# Altium footprint library AMA4B_adapter_board.PcbLib: 73 footprints (part 4 of 5)
Each footprint in its own frame and in the unit in brackets; x right, y up, seen from the top. Pads: shape width x height; smd on the part's side, far side on the other; paste and mask are expansions set on the pad; w line width, h text height; cw(c..) or ccw(c..) is an arc to the next point about the centre after c.
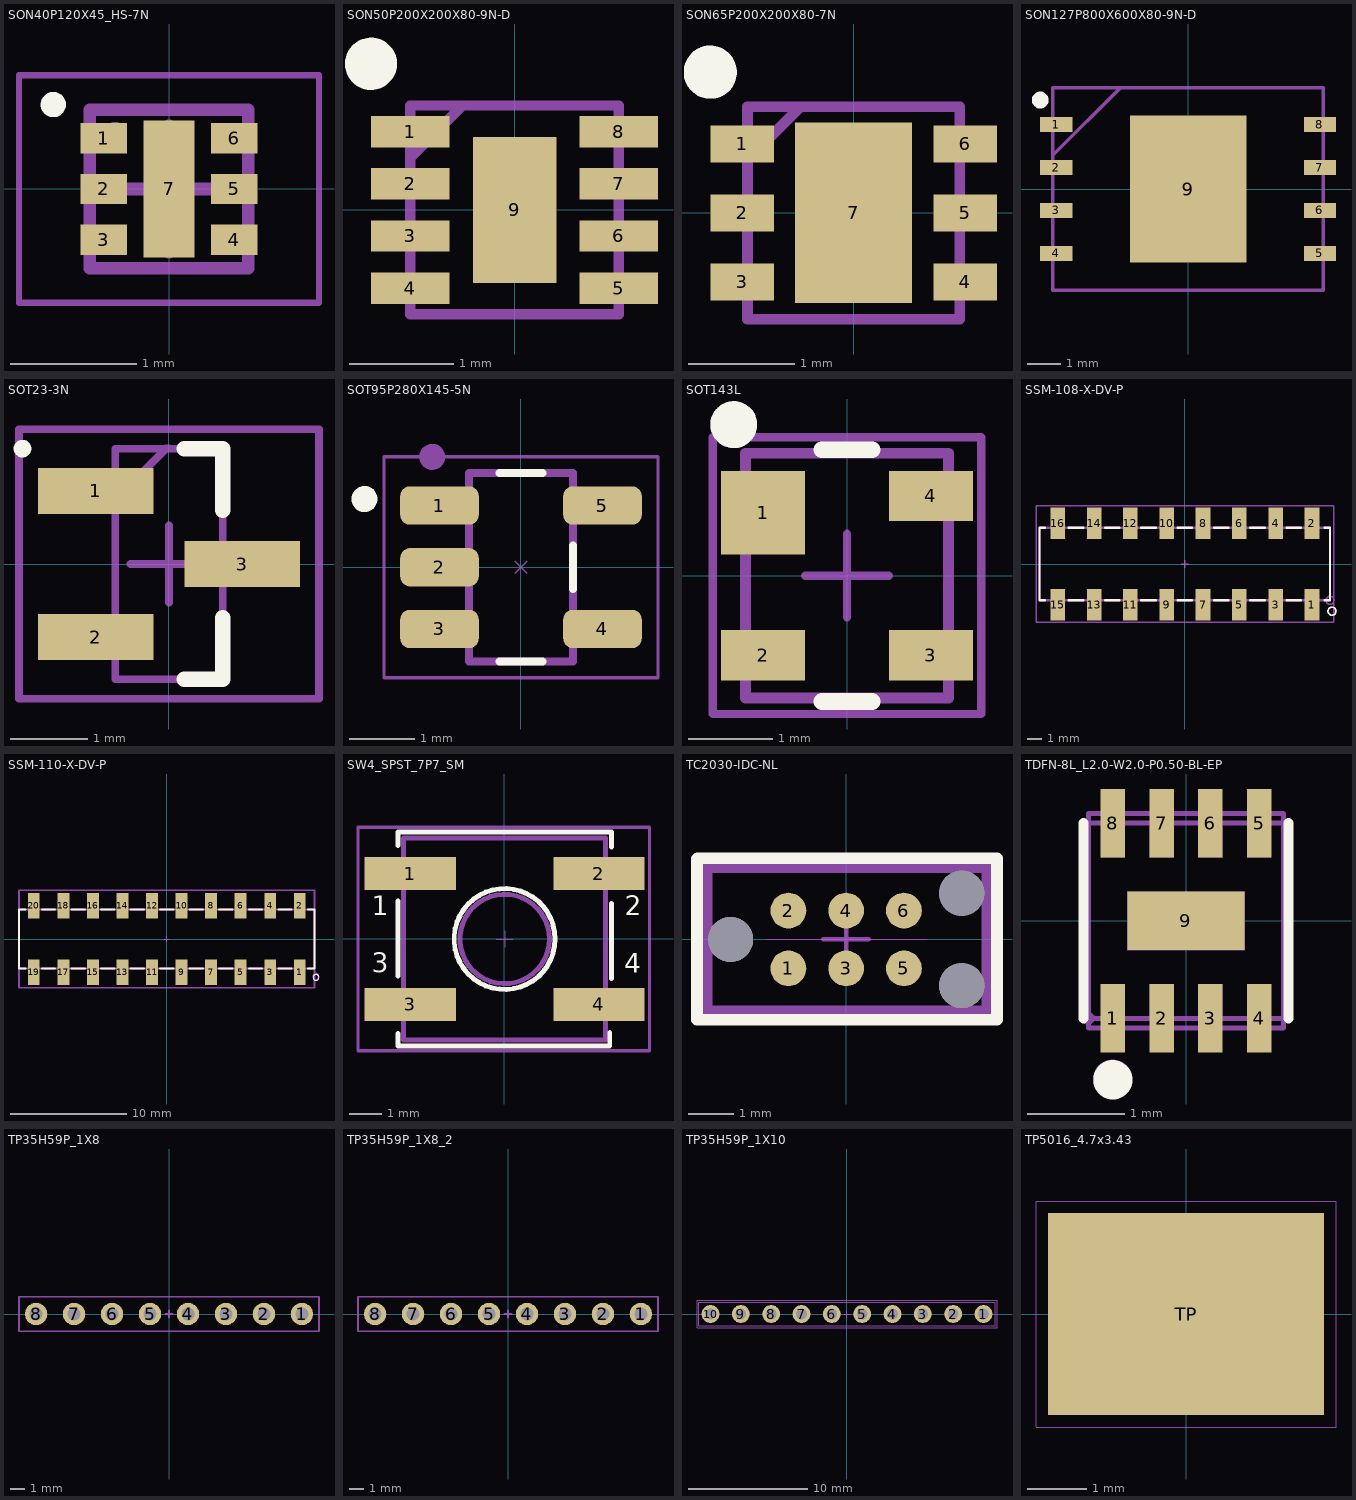
[diagram p3: the footprints below, top view; thin cyan lines are the x and y axes]

## SON40P120X45_HS-7N [mm] "SON, 6-Leads, Body 1.20x1.20mm, Pitch 0.40mm, Thermal Pad 2.40x0.79mm, IPC Medium Density"
height 0.45
pads (7):
  rect 0.37x0.24 smd paste+0 mask+0.03: 1(-0.515,0.4) 2(-0.515,0) 3(-0.515,-0.4) 4(0.515,-0.4) 5(0.515,0) 6(0.515,0.4)
  rect 0.4x1.08 smd paste+0 mask+0.03: 7(0,0)
Top Overlay:
  circle w0.1: c-0.914,0.667 r0.05
Board Shape:
  circle w0.152: c-0.426,0.444 r0.009
  lines w0.1: -0.625,-0.625 -0.625,0.625 0.625,0.625 0.625,-0.625 -0.625,-0.625
  text ".Designator" at -2.261,-0.275 h1
Top Courtyard:
  lines w0.05: -1.185,-0.9 1.185,-0.9 1.185,0.9 -1.185,0.9 -1.185,-0.9
  lines w0.051: -1.185,-0.9 1.185,-0.9 1.185,0.9 -1.185,0.9 -1.185,-0.9
Top Component Center:
  lines w0.1: -0.5,0 0.5,0 ; 0,-0.5 0,0.5
3D body "SON40P120X45_HS-7N.step": height 0.45, standoff 0, extent -0.626,-0.625 0.626,0.625

## SON50P200X200X80-9N-D [mm]
pads (9):
  rect 0.75x0.3 smd: 1(-1,0.75) 2(-1,0.25) 3(-1,-0.25) 4(-1,-0.75) 5(1,-0.75) 6(1,-0.25) 7(1,0.25) 8(1,0.75)
  rect 0.8x1.4 smd: 9(0,0)
Top Overlay:
  circle w0.25: c-1.375,1.4 r0.125
Top 3D Body:
  lines w0.1: -1,0.5 -0.5,1 ; -1,-1 1,-1 1,1 -1,1 -1,-1
3D body "MAX8902BATA+.stp": height 0.8, standoff 0, extent -1.05,-1 1.05,1

## SON65P200X200X80-7N [mm]
pads (7):
  rect 0.6x0.35 smd: 1(-1.05,0.65) 2(-1.05,0) 3(-1.05,-0.65) 4(1.05,-0.65) 5(1.05,0) 6(1.05,0.65)
  rect 1.1x1.7 smd: 7(0,0)
Top Overlay:
  circle w0.25: c-1.35,1.325 r0.125
Top Assembly:
  lines w0.1: -1,0.5 -0.5,1 ; -1,-1 1,-1 1,1 -1,1 -1,-1
  text ".Designator" at -1.126,-0.113 h0.5
3D body "TLV75801PDRVR.stp": height 0.8, standoff 0, extent -1.05,-1 1.05,1

## SON127P800X600X80-9N-D [mm]
pads (9):
  rect 0.95x0.45 smd: 1(-3.9,1.905) 2(-3.9,0.635) 3(-3.9,-0.635) 4(-3.9,-1.905) 5(3.9,-1.905) 6(3.9,-0.635) 7(3.9,0.635) 8(3.9,1.905)
  rect 3.45x4.35 smd: 9(0,0)
Top Overlay:
  circle w0.25: c-4.375,2.63 r0.125
Top Assembly:
  lines w0.1: -4,1 -2,3 ; -4,-3 -4,3 4,3 4,-3 -4,-3
  text ".Designator" at -2.252,-0.226 h1
3D body "W25N01GVZEIG_TR.stp": height 0.8, standoff 0, extent -4.05,-3 4.05,3

## SOT23-3N [mm] "SOT23, 3-Leads, Body 2.9x1.3mm, Pitch 0.95mm, Lead Span 2.5mm, IPC Medium Density"
height 1.1
pads (3):
  rect 1.5x0.6 smd: 1(-0.95,0.95) 2(-0.95,-0.95) 3(0.95,0)
Top Overlay:
  circle w0.152: c-1.905,1.5 r0.038
  lines w0.2: 0.2,-1.5 0.7,-1.5 0.7,-0.7 ; 0.2,1.5 0.7,1.5 0.7,0.7
Board Shape:
  lines w0.1: -0.7,-1.5 -0.7,1.5 0.7,1.5 0.7,-1.5 -0.7,-1.5
  lines w0.102: -0.692,0.847 -0.039,1.5 0,1.5
  text ".Designator" at -2.289,-0.23 h1.02
Top Courtyard:
  lines w0.1: -1.95,-1.75 1.95,-1.75 1.95,1.75 -1.95,1.75 -1.95,-1.75
Top Component Center:
  lines w0.1: -0.5,0 0.5,0 ; 0,-0.5 0,0.5
3D body "SOT23.STEP": height 1.08, standoff 0, extent -1.345,-1.5 1.295,1.5

## SOT95P280X145-5N [mm]
pads (5):
  rrect50% 1.21x0.59 smd: 1(-1.255,0.95) 2(-1.255,0) 3(-1.255,-0.95) 4(1.255,-0.95) 5(1.255,0.95)
Top Overlay:
  circle w0.2: c-2.41,1.05 r0.1
  lines w0.127: -0.33,-1.45 0.33,-1.45 ; -0.33,1.45 0.33,1.45 ; 0.8,-0.335 0.8,0.335
Board Shape:
  lines w0.127: -0.8,-1.45 0.8,-1.45 0.8,1.45 -0.8,1.45 -0.8,-1.45
  lines w0.2: -1.267,1.7 cw(c-1.367,1.7) -1.267,1.703
  text "'.Designator'" at 0.156,-0.6 h1
Top Courtyard:
  lines w0.05: -2.11,-1.7 -2.11,1.7 2.11,1.7 2.11,-1.7 -2.11,-1.7
Top Component Center:
  lines w0.025: -0.09,-0.09 0,0 ; -0.09,0.09 0,0 ; 0.09,-0.09 0,0 ; 0.09,0.09 0,0

## SOT143L [mm]
pads (4):
  rect 1x1 smd: 1(-1,0.75)
  rect 1x0.6 smd: 2(-1,-0.95) 3(1,-0.95) 4(1,0.95)
Top Overlay:
  circle w0.305: c-1.35,1.8 r0.127
  lines w0.2: -0.3,-1.5 0.3,-1.5 ; -0.3,1.5 0.3,1.5
Board Shape:
  circle w0.305: c-1.35,1.8 r0.127
  lines w0.127: -1.21,-1.46 -1.21,1.46 1.21,1.46 1.21,-1.46 -1.21,-1.46
  lines w0.2: -0.3,-1.5 0.3,-1.5 ; -0.3,1.5 0.3,1.5
  text ".Designator" at -0.319,3.459 h1.52
Top 3D Body:
  lines w0.127: -1.21,-1.46 -1.21,1.46 1.21,1.46 1.21,-1.46 -1.21,-1.46
Top Courtyard:
  lines w0.1: -1.6,-1.65 -1.6,1.65 1.6,1.65 1.6,-1.65 -1.6,-1.65
Top Component Center:
  lines w0.1: -0.5,0 0.5,0 ; 0,-0.5 0,0.5
3D body "User Library-sot143.STEP": height 1, standoff 0, extent -1.21,-1.46 1.21,1.46

## SSM-108-X-DV-P [mil] "SSM-108-X-DV-P"
pads (16):
  rect 40.2x87.4 smd: 1(350,-112.5) 2(350,112.5) 3(250,-112.5) 4(250,112.5) 5(150,-112.5) 6(150,112.5) 7(50,-112.5) 8(50,112.5) 9(-50,-112.5) 10(-50,112.5) 11(-150,-112.5) 12(-150,112.5) 13(-250,-112.5) 14(-250,112.5) 15(-350,-112.5) 16(-350,112.5)
Top Overlay:
  circle w4: c405,-130 r11.18
  lines w6: -385,-100 -400,-100 -400,100 -385,100 ; -320,-100 -280,-100 ; -320,100 -280,100 ; -220,-100 -180,-100 ; -220,100 -180,100 ; -120,-100 -80,-100 ; -120,100 -80,100 ; -20,-100 20,-100 ; -20,100 20,100 ; 80,-100 120,-100 ; 80,100 120,100 ; 180,-100 220,-100 ; 180,100 220,100 ; 280,-100 320,-100 ; 280,100 320,100 ; 385,-100 400,-100 400,100 385,100
Board Shape:
  circle w4: c400,-100 r11.18
  lines w6: -400,-100 -400,100 400,100 400,-100 -400,-100
  text ".Designator" at -90.13,7.51 h40
Top Courtyard:
  lines w4: -410,-160 410,-160 410,160 -410,160 -410,-160
Top Component Center:
  lines w4: -10,0 10,0 ; 0,-10 0,10
3D body "SSM-108-L-DV-P-TR.stp": height 338, standoff -4, extent -400,-138.5 400,138.5

## SSM-110-X-DV-P [mil] "SSM-110-X-DV-P"
pads (20):
  rect 40.2x87.4 smd: 1(450,-112.5) 2(450,112.5) 3(350,-112.5) 4(350,112.5) 5(250,-112.5) 6(250,112.5) 7(150,-112.5) 8(150,112.5) 9(50,-112.5) 10(50,112.5) 11(-50,-112.5) 12(-50,112.5) 13(-150,-112.5) 14(-150,112.5) 15(-250,-112.5) 16(-250,112.5) 17(-350,-112.5) 18(-350,112.5) 19(-450,-112.5) 20(-450,112.5)
Top Overlay:
  circle w4: c505,-130 r10
  lines w6: -477.05,-100 -500,-100 -500,100 -477.05,100 ; -422.95,-100 -377.05,-100 ; -422.95,100 -377.05,100 ; -322.95,-100 -277.05,-100 ; -322.95,100 -277.05,100 ; -222.95,-100 -177.05,-100 ; -222.95,100 -177.05,100 ; -122.95,-100 -77.05,-100 ; -122.95,100 -77.05,100 ; -22.95,-100 22.95,-100 ; -22.95,100 22.95,100 ; 77.05,-100 122.95,-100 ; 77.05,100 122.95,100 ; 177.05,-100 222.95,-100 ; 177.05,100 222.95,100 ; 277.05,-100 322.95,-100 ; 277.05,100 322.95,100 ; 377.05,-100 422.95,-100 ; 377.05,100 422.95,100 ; 477.05,-100 500,-100 500,100 477.05,100
Board Shape:
  circle w4: c504.32,-126.26 r10
  lines w6: -500,-100 500,-100 500,100 -500,100 -500,-100
  text ".Designator" at -90.13,7.51 h40
Top Courtyard:
  lines w6: -500,-165 -500,165 500,165 500,-165 -500,-165
Top Component Center:
  lines w4: -10,0 10,0 ; 0,-10 0,10
3D body "SSM-110-L-DV-P.stp": height 338, standoff -4, extent -500,-138.5 500,138.5

## SW4_SPST_7P7_SM [mil]
pads (4):
  rect 110x40 smd: 1(-113.61,78.45) 2(114.39,78.45) 3(-113.61,-79.55) 4(114.39,-79.55)
Top Overlay:
  circle w6: c0.39,-0.55 r61
  lines w6: -128.61,-114.55 -128.61,-129.55 127.39,-129.55 127.39,-113.55 ; -128.61,-45.55 -128.61,45.45 ; -128.61,112.45 -128.61,128.45 129.39,128.45 129.39,110.45 ; 129.39,-48.55 129.39,42.45
  text "1" at -160.24,20.16 h40
  text "3" at -160.24,-48.82 h40
  text "2" at 145.67,20.16 h40
  text "4" at 144.94,-49.25 h40
Board Shape:
  circle w6: c0.39,-0.55 r54
  lines w6: -121.61,-122.55 -121.61,121.45 122.39,121.45 122.39,-122.55 -121.61,-122.55
  text "1" at -166.02,107.13 h25
  text "2" at 155.63,106.61 h25
  text "4" at 153.58,-124.92 h25
  text "3" at -166.54,-125.43 h25
  text ".Designator" at -64.61,84.45 h25
Top Courtyard:
  lines w4: -176.72,-135.55 -176.72,134.45 175.31,134.45 175.31,-135.55 -176.72,-135.55
Top Component Center:
  lines w1: -9.61,-0.55 10.39,-0.55 ; 0.39,-10.55 0.39,9.45
3D body "KSC441J70SHLFS.stp": height 204.53, standoff 0.04, extent -133.86,-124.02 133.86,124.02

## TC2030-IDC-NL [mil] "TC2030-IDC"
pads (9):
  round 30.98 smd paste+0 mask+1.97: 1(-50,-25)
  round 30.98 smd paste-39.37 mask+1.97: 2(-50,25) 3(0,-25) 4(0,25) 5(50,-25) 6(50,25)
  round 39.02 hole 39.02 unplated paste-39.37 mask+0: ""(-100,0) ""(100,-40) ""(100,40)
Top Layer keep-out:
  region: -69.6,0.39 70.31,0.39 70.31,-0.39 -69.6,-0.39
Top Overlay:
  lines w10: -129.09,-69.57 130.51,-69.57 130.51,70.35 -128.65,70.35 -129.09,69.91 -129.09,-69.57
Board Shape:
  text ".Designator" at -135.28,-13.37 h60
Top Courtyard:
  lines w10: -120.71,-62.28 -120.71,62.72 121.93,62.72 121.93,-62.28 -120.71,-62.28
Top Component Center:
  lines w3.94: -19.76,0.2 19.61,0.2 ; -0.08,-19.49 -0.08,19.88

## TDFN-8L_L2.0-W2.0-P0.50-BL-EP [mm]
pads (9):
  rect 0.25x0.7 smd: 1(-0.75,-1) 2(-0.25,-1) 3(0.25,-1) 4(0.75,-1) 5(0.75,1) 6(0.25,1) 7(-0.25,1) 8(-0.75,1)
  rect 1.2x0.6 smd: 9(0,-0.001)
Top Overlay:
  circle w0.3: c-0.75,-1.63 r0.051
  lines w0.102: -1.05,-1 -1.05,1 ; 1.05,-1 1.05,1
Top Assembly:
  circle w0.2: c-0.753,-1.624 r0.1
  lines w0.05: -1,-1.1 -1,1.1 1,1.1 1,-1.1 -1,-1.1
  text ".Designator" at -1.126,-0.113 h0.5
Top Courtyard:
  region: 0.63,-0.65 0.87,-0.65 0.87,-1 0.63,-1
  region: -0.6,0.299 0.6,0.299 0.6,-0.301 -0.6,-0.301
  region: 0.13,-0.65 0.37,-0.65 0.37,-1 0.13,-1
  region: -0.37,-0.65 -0.13,-0.65 -0.13,-1 -0.37,-1
  region: -0.87,-0.65 -0.63,-0.65 -0.63,-1 -0.87,-1
  region: -0.63,0.65 -0.87,0.65 -0.87,1 -0.63,1
  region: -0.13,0.65 -0.37,0.65 -0.37,1 -0.13,1
  region: 0.37,0.65 0.13,0.65 0.13,1 0.37,1
  region: 0.87,0.65 0.63,0.65 0.63,1 0.87,1
  region: -0.94,-1 -0.94,-0.975 -0.975,-0.94 -1.025,-0.94 -1.06,-0.975 -1.06,-1 -1.06,-1.025 -1.025,-1.06 -0.975,-1.06 -0.94,-1.025
  lines w0.051: -1,-1 1,-1 1,1 -1,1 -1,-1
3D body "MAX8902BATA+.stp": height 0.8, standoff 0, extent -1,-1.051 1,1.049

## TP35H59P_1X8 [mil] "TP35H59P_1X8"
pads (8):
  round 59 hole 35: 1(350,0) 2(250,0) 3(150,0) 4(50,0) 5(-50,0) 6(-150,0) 7(-250,0) 8(-350,0)
Board Shape:
  lines w4: -395,-45 -395,45 395,45 395,-45 -395,-45
  text "8" at -435,-12.63 h40
  text ".Designator" at 94.13,3.49 h40
  text "1" at 410,-12.85 h40
Top Courtyard:
  lines w4: -395,-45 -395,45 395,45 395,-45 -395,-45
Top Component Center:
  lines w4: -10,0 10,0 ; 0,-10 0,10

## TP35H59P_1X8_2 [mil]
pads (8):
  round 59 hole 35: 1(350,0) 2(250,0) 3(150,0) 4(50,0) 5(-50,0) 6(-150,0) 7(-250,0) 8(-350,0)
Board Shape:
  lines w4: -395,-45 395,-45 395,45 -395,45 -395,-45
  text "1" at 410,-12.85 h40
  text ".Designator" at 93.13,10.49 h40
  text "8" at -435,-12.63 h40
Top Courtyard:
  lines w4: -395,-45 395,-45 395,45 -395,45 -395,-45
Top Component Center:
  lines w4: -10,0 10,0 ; 0,-10 0,10

## TP35H59P_1X10 [mil] "TP35H59P_1X10"
pads (10):
  round 59 hole 35: 1(450,0) 2(350,0) 3(250,0) 4(150,0) 5(50,0) 6(-50,0) 7(-150,0) 8(-250,0) 9(-350,0) 10(-450,0)
Board Shape:
  lines w4: -494.51,-44.51 -494.51,44.51 494.51,44.51 494.51,-44.51 -494.51,-44.51
  text "10" at -543.43,-12.63 h40
  text "1" at 514.06,-12.85 h40
  text ".Designator" at -90.13,7.51 h40
Top Courtyard:
  lines w1: -489.5,-39.5 -489.5,39.5 489.5,39.5 489.5,-39.5 -489.5,-39.5
Top Component Center:
  lines w4: -10,0 10,0 ; 0,-10 0,10

## TP5016_4.7x3.43 [mm] "SMD Test point loop"
height 2.29
pads (1):
  rect 4.7x3.43 smd mask+0.05: TP(0,0)
Board Shape:
  lines w0.02: -1.905,-1.42 1.905,-1.42 1.905,1.42 -1.905,1.42 -1.905,-1.42
  text ".Designator" at 0.19,-0.813 h1.02
Top Courtyard:
  lines w0.02: -2.55,-1.925 2.55,-1.925 ; -2.55,-1.915 -2.55,1.915 2.55,1.915 2.55,-1.915
Top Component Center:
  lines w0.02: -0.052,-0.052 0,0 ; -0.052,0.052 0,0 ; 0.052,-0.052 0,0 ; 0.052,0.052 0,0
3D body "keystone-PN5016.STEP": height 2.5, standoff 0.21, extent -1.912,-1.434 1.898,1.422